# Altium footprint library Connectors.PcbLib: 101 footprints (part 2 of 7)
Each footprint in its own frame and in the unit in brackets; x right, y up, seen from the top. Pads: shape width x height; smd on the part's side, far side on the other; paste and mask are expansions set on the pad; w line width, h text height; cw(c..) or ccw(c..) is an arc to the next point about the centre after c.
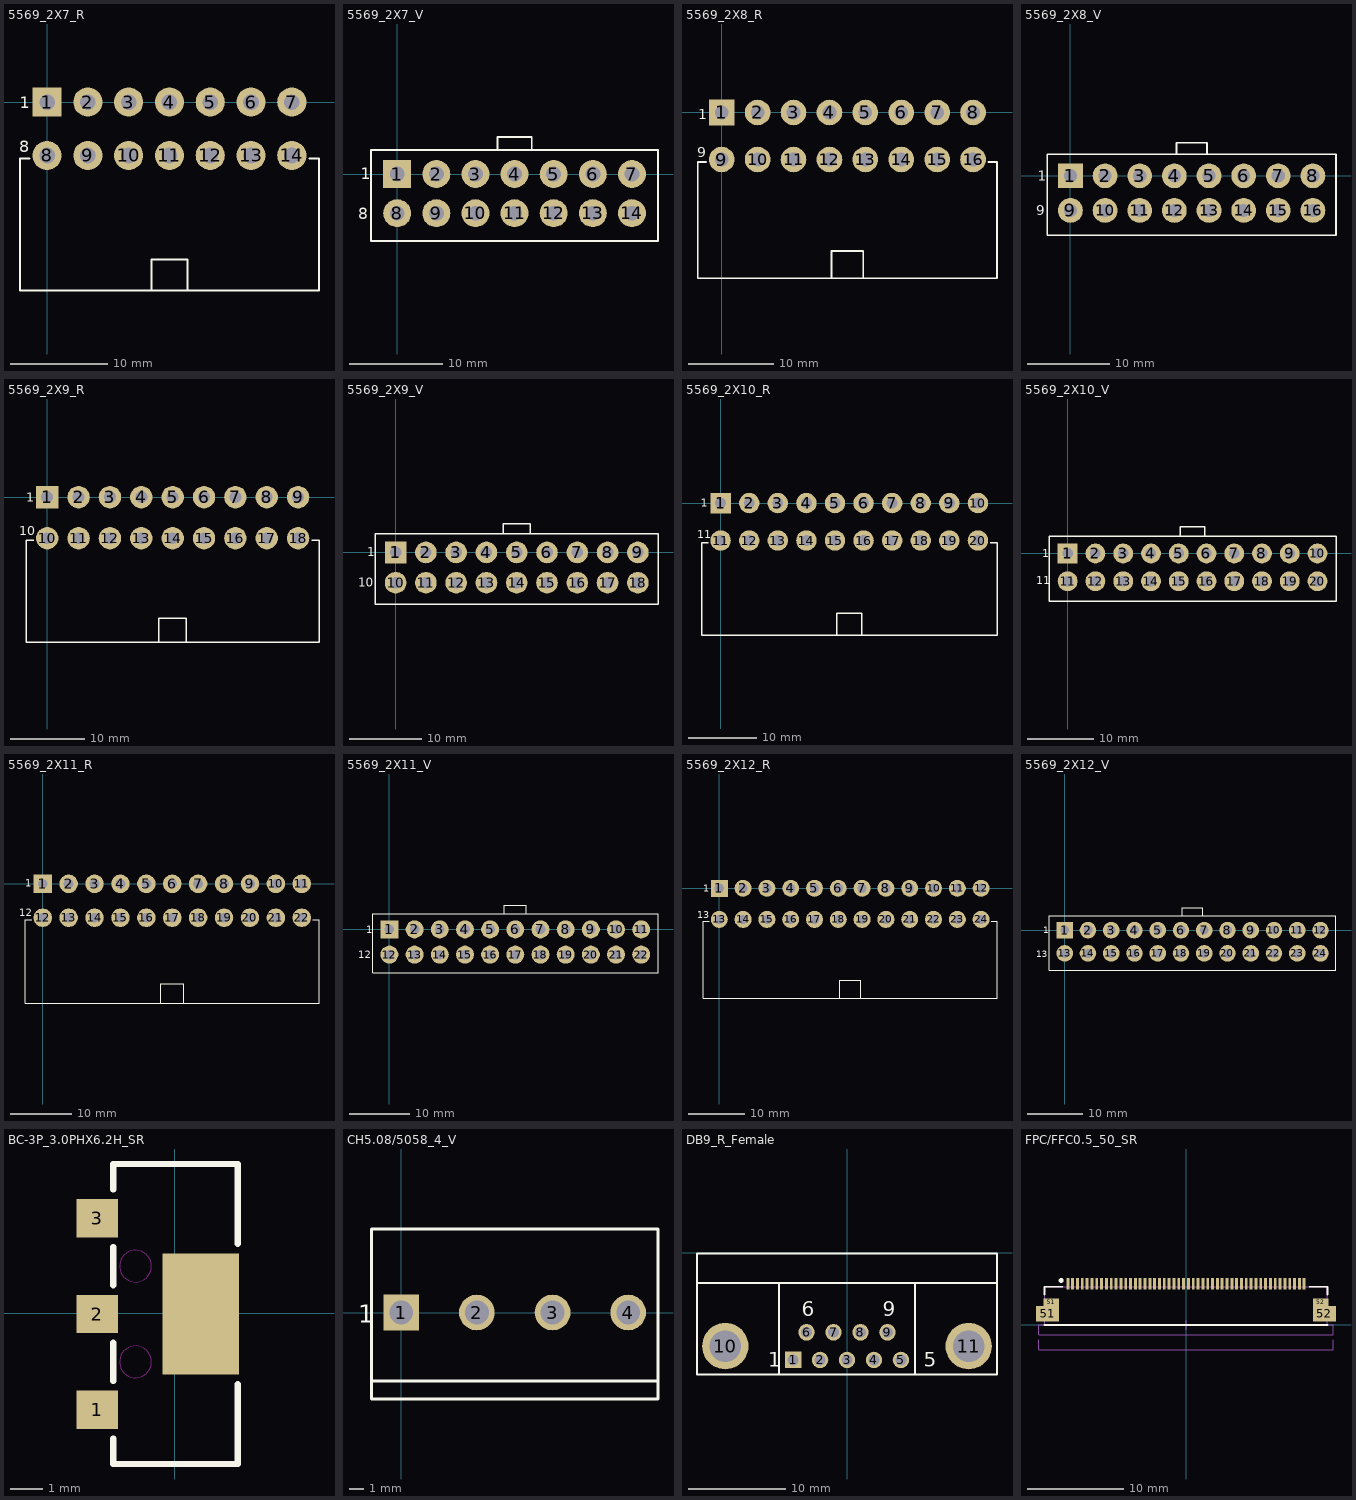
[diagram p1: the footprints below, top view; thin cyan lines are the x and y axes]

## 5569_2X7_R [mm] "5569 Connector, 7-Pin, Dual row, Right Angle"
pads (14):
  rect 3x3 hole 1.6 paste+0 mask+0.1: 1(0,0)
  round 3 hole 1.6 paste+0 mask+0.1: 2(4.2,0) 3(8.4,0) 4(12.6,0) 5(16.8,0) 6(21,0) 7(25.2,0) 8(0,-5.5) 9(4.2,-5.5) 10(8.4,-5.5) 11(12.6,-5.5) 12(16.8,-5.5) 13(21,-5.5) 14(25.2,-5.5)
Top Overlay:
  lines w0.2: -1.8,-5.8 -2.8,-5.8 -2.8,-19.4 28,-19.4 28,-5.8 27,-5.8 ; 10.75,-19.4 10.75,-16.2 14.45,-16.2 14.45,-19.385
  text "8" at -2.89,-5.17 h1.2
  text "1" at -2.8,-0.65 h1.2
3D body "874271402.stp": height 11.4, standoff -3.3, extent -3.3,-19.385 28.5,0.55

## 5569_2X7_V [mm] "5569 Connector, 7-Pin, Dual row, Vertical"
pads (14):
  rect 3x3 hole 1.6 paste+0 mask+0.1: 1(0,0)
  round 3 hole 1.6 paste+0 mask+0.1: 2(4.2,0) 3(8.4,0) 4(12.6,0) 5(16.8,0) 6(21,0) 7(25.2,0) 8(0,-4.2) 9(4.2,-4.2) 10(8.4,-4.2) 11(12.6,-4.2) 12(16.8,-4.2) 13(21,-4.2) 14(25.2,-4.2)
Top Overlay:
  lines w0.2: 10.75,2.6 10.75,4 14.45,4 14.45,2.6 ; -2.8,-7.2 28,-7.2 28,2.6 -2.8,2.6 -2.8,-7.2
  text "1" at -3.92,-0.57 h1.2
  text "8" at -4.21,-4.86 h1.2
3D body "874271442.stp": height 13.5, standoff -3.3, extent -3.3,-7.5 28.5,3.9

## 5569_2X8_R [mm] "5569 Connector, 8-Pin, Dual row, Right Angle"
pads (16):
  rect 3x3 hole 1.6 paste+0 mask+0.1: 1(0,0)
  round 3 hole 1.6 paste+0 mask+0.1: 2(4.2,0) 3(8.4,0) 4(12.6,0) 5(16.8,0) 6(21,0) 7(25.2,0) 8(29.4,0) 9(0,-5.5) 10(4.2,-5.5) 11(8.4,-5.5) 12(12.6,-5.5) 13(16.8,-5.5) 14(21,-5.5) 15(25.2,-5.5) 16(29.4,-5.5)
Top Overlay:
  lines w0.2: -1.8,-5.8 -2.8,-5.8 -2.8,-19.4 32.2,-19.4 32.2,-5.8 31.2,-5.8 ; 12.85,-19.4 12.85,-16.2 16.55,-16.2 16.55,-19.385
  text "9" at -2.89,-5.21 h1.2
  text "1" at -2.77,-0.8 h1.2
3D body "874271602.stp": height 11.4, standoff -3.3, extent -3.3,-19.385 32.7,0.55

## 5569_2X8_V [mm] "5569 Connector, 8-Pin, Dual row, Vertical"
pads (16):
  rect 3x3 hole 1.6 paste+0 mask+0.1: 1(0,0)
  round 3 hole 1.6 paste+0 mask+0.1: 2(4.2,0) 3(8.4,0) 4(12.6,0) 5(16.8,0) 6(21,0) 7(25.2,0) 8(29.4,0) 9(0,-4.2) 10(4.2,-4.2) 11(8.4,-4.2) 12(12.6,-4.2) 13(16.8,-4.2) 14(21,-4.2) 15(25.2,-4.2) 16(29.4,-4.2)
Top Overlay:
  lines w0.2: 12.85,2.6 12.85,4 16.55,4 16.55,2.6 ; -2.8,-7.2 32.2,-7.2 32.2,2.6 -2.8,2.6 -2.8,-7.2
  text "9" at -4.18,-4.79 h1.2
  text "1" at -3.94,-0.57 h1.2
3D body "874271642.stp": height 13.5, standoff -3.3, extent -3.3,-7.5 32.7,3.9

## 5569_2X9_R [mm] "5569 Connector, 9-Pin, Dual row, Right Angle"
pads (18):
  rect 3x3 hole 1.6 paste+0 mask+0.1: 1(0,0)
  round 3 hole 1.6 paste+0 mask+0.1: 2(4.2,0) 3(8.4,0) 4(12.6,0) 5(16.8,0) 6(21,0) 7(25.2,0) 8(29.4,0) 9(33.6,0) 10(0,-5.5) 11(4.2,-5.5) 12(8.4,-5.5) 13(12.6,-5.5) 14(16.8,-5.5) 15(21,-5.5) 16(25.2,-5.5) 17(29.4,-5.5) 18(33.6,-5.5)
Top Overlay:
  lines w0.2: -1.8,-5.8 -2.8,-5.8 -2.8,-19.4 36.4,-19.4 36.4,-5.8 35.4,-5.8 ; 14.95,-19.4 14.95,-16.2 18.65,-16.2 18.65,-19.385
  text "10" at -3.78,-5.09 h1.2
  text "1" at -2.78,-0.59 h1.2
3D body "874271802.stp": height 11.4, standoff -3.3, extent -3.3,-19.385 36.9,0.55

## 5569_2X9_V [mm] "5569 Connector, 9-Pin, Dual row, Vertical"
pads (18):
  rect 3x3 hole 1.6 paste+0 mask+0.1: 1(0,0)
  round 3 hole 1.6 paste+0 mask+0.1: 2(4.2,0) 3(8.4,0) 4(12.6,0) 5(16.8,0) 6(21,0) 7(25.2,0) 8(29.4,0) 9(33.6,0) 10(0,-4.2) 11(4.2,-4.2) 12(8.4,-4.2) 13(12.6,-4.2) 14(16.8,-4.2) 15(21,-4.2) 16(25.2,-4.2) 17(29.4,-4.2) 18(33.6,-4.2)
Top Overlay:
  lines w0.2: 14.95,2.6 14.95,4 18.65,4 18.65,2.6 ; -2.8,-7.2 -2.8,2.6 36.4,2.6 36.4,-7.2 -2.8,-7.2
  text "10" at -5.22,-4.74 h1.2
  text "1" at -3.91,-0.55 h1.2
3D body "874271842.stp": height 13.5, standoff -3.3, extent -3.3,-7.5 36.9,3.9

## 5569_2X10_R [mm] "5569 Connector, 10-Pin, Dual row, Right Angle"
pads (20):
  rect 3x3 hole 1.6 paste+0 mask+0.1: 1(0,0)
  round 3 hole 1.6 paste+0 mask+0.1: 2(4.2,0) 3(8.4,0) 4(12.6,0) 5(16.8,0) 6(21,0) 7(25.2,0) 8(29.4,0) 9(33.6,0) 10(37.8,0) 11(0,-5.5) 12(4.2,-5.5) 13(8.4,-5.5) 14(12.6,-5.5) 15(16.8,-5.5) 16(21,-5.5) 17(25.2,-5.5) 18(29.4,-5.5) 19(33.6,-5.5) 20(37.8,-5.5)
Top Overlay:
  lines w0.2: -1.8,-5.8 -2.8,-5.8 -2.8,-19.4 40.6,-19.4 40.6,-5.8 39.6,-5.8 ; 17.05,-19.4 17.05,-16.2 20.75,-16.2 20.75,-19.385
  text "11" at -3.47,-5.18 h1.2
  text "1" at -2.93,-0.51 h1.2
3D body "874272002.stp": height 11.4, standoff -3.3, extent -3.3,-19.385 41.1,0.55

## 5569_2X10_V [mm] "5569 Connector, 10-Pin, Dual row, Vertical"
pads (20):
  rect 3x3 hole 1.6 paste+0 mask+0.1: 1(0,0)
  round 3 hole 1.6 paste+0 mask+0.1: 2(4.2,0) 3(8.4,0) 4(12.6,0) 5(16.8,0) 6(21,0) 7(25.2,0) 8(29.4,0) 9(33.6,0) 10(37.8,0) 11(0,-4.2) 12(4.2,-4.2) 13(8.4,-4.2) 14(12.6,-4.2) 15(16.8,-4.2) 16(21,-4.2) 17(25.2,-4.2) 18(29.4,-4.2) 19(33.6,-4.2) 20(37.8,-4.2)
Top Overlay:
  lines w0.2: 17.05,2.6 17.05,4 20.75,4 20.75,2.6 ; -2.8,-7.2 -2.8,2.6 40.6,2.6 40.6,-7.2 -2.8,-7.2
  text "11" at -4.79,-4.69 h1.2
  text "1" at -3.87,-0.55 h1.2
3D body "874272042.stp": height 13.5, standoff -3.3, extent -3.3,-7.5 41.1,3.9

## 5569_2X11_R [mm] "5569 Connector, 11-Pin, Dual row, Right Angle"
pads (22):
  rect 3x3 hole 1.6 paste+0 mask+0.1: 1(0,0)
  round 3 hole 1.6 paste+0 mask+0.1: 2(4.2,0) 3(8.4,0) 4(12.6,0) 5(16.8,0) 6(21,0) 7(25.2,0) 8(29.4,0) 9(33.6,0) 10(37.8,0) 11(42,0) 12(0,-5.5) 13(4.2,-5.5) 14(8.4,-5.5) 15(12.6,-5.5) 16(16.8,-5.5) 17(21,-5.5) 18(25.2,-5.5) 19(29.4,-5.5) 20(33.6,-5.5) 21(37.8,-5.5) 22(42,-5.5)
Top Overlay:
  lines w0.2: -1.8,-5.8 -2.8,-5.8 -2.8,-19.4 44.8,-19.4 44.8,-5.8 43.8,-5.8 ; 19.15,-19.4 19.15,-16.2 22.85,-16.2 22.85,-19.385
  text "12" at -3.85,-5.23 h1.2
  text "1" at -2.81,-0.51 h1.2
3D body "874272202.stp": height 11.4, standoff -3.3, extent -3.3,-19.385 45.3,0.55

## 5569_2X11_V [mm] "5569 Connector, 11-Pin, Dual row, Vertical"
pads (22):
  rect 3x3 hole 1.6 paste+0 mask+0.1: 1(0,0)
  round 3 hole 1.6 paste+0 mask+0.1: 2(4.2,0) 3(8.4,0) 4(12.6,0) 5(16.8,0) 6(21,0) 7(25.2,0) 8(29.4,0) 9(33.6,0) 10(37.8,0) 11(42,0) 12(0,-4.2) 13(4.2,-4.2) 14(8.4,-4.2) 15(12.6,-4.2) 16(16.8,-4.2) 17(21,-4.2) 18(25.2,-4.2) 19(29.4,-4.2) 20(33.6,-4.2) 21(37.8,-4.2) 22(42,-4.2)
Top Overlay:
  lines w0.2: 19.15,2.6 19.15,4 22.85,4 22.85,2.6 ; -2.8,-7.2 -2.8,2.6 44.8,2.6 44.8,-7.2 -2.8,-7.2
  text "1" at -3.88,-0.61 h1.2
  text "12" at -5.24,-4.84 h1.2
3D body "874272242.stp": height 13.5, standoff -3.3, extent -3.3,-7.5 45.3,3.9

## 5569_2X12_R [mm] "5569 Connector, 12-Pin, Dual row, Right Angle"
pads (24):
  rect 3x3 hole 1.6 paste+0 mask+0.1: 1(0,0)
  round 3 hole 1.6 paste+0 mask+0.1: 2(4.2,0) 3(8.4,0) 4(12.6,0) 5(16.8,0) 6(21,0) 7(25.2,0) 8(29.4,0) 9(33.6,0) 10(37.8,0) 11(42,0) 12(46.2,0) 13(0,-5.5) 14(4.2,-5.5) 15(8.4,-5.5) 16(12.6,-5.5) 17(16.8,-5.5) 18(21,-5.5) 19(25.2,-5.5) 20(29.4,-5.5) 21(33.6,-5.5) 22(37.8,-5.5) 23(42,-5.5) 24(46.2,-5.5)
Top Overlay:
  lines w0.2: -1.8,-5.8 -2.8,-5.8 -2.8,-19.4 49,-19.4 49,-5.8 48,-5.8 ; 21.25,-19.4 21.25,-16.2 24.95,-16.2 24.95,-19.385
  text "1" at -2.82,-0.6 h1.2
  text "13" at -3.93,-5.28 h1.2
3D body "874272402.stp": height 11.4, standoff -3.3, extent -3.3,-19.385 49.5,0.55

## 5569_2X12_V [mm] "5569 Connector, 12-Pin, Dual row, Vertical"
pads (24):
  rect 3x3 hole 1.6 paste+0 mask+0.1: 1(0,0)
  round 3 hole 1.6 paste+0 mask+0.1: 2(4.2,0) 3(8.4,0) 4(12.6,0) 5(16.8,0) 6(21,0) 7(25.2,0) 8(29.4,0) 9(33.6,0) 10(37.8,0) 11(42,0) 12(46.2,0) 13(0,-4.2) 14(4.2,-4.2) 15(8.4,-4.2) 16(12.6,-4.2) 17(16.8,-4.2) 18(21,-4.2) 19(25.2,-4.2) 20(29.4,-4.2) 21(33.6,-4.2) 22(37.8,-4.2) 23(42,-4.2) 24(46.2,-4.2)
Top Overlay:
  lines w0.2: 21.25,2.6 21.25,4 24.95,4 24.95,2.6 ; -2.8,-7.2 49,-7.2 49,2.6 -2.8,2.6 -2.8,-7.2
  text "13" at -5.19,-4.88 h1.2
  text "1" at -3.9,-0.52 h1.2
3D body "874272442.stp": height 13.5, standoff -3.3, extent -3.3,-7.5 49.5,3.9

## BC-3P_3.0PHX6.2H_SR [mm] "Battery connector, 3 Pin, 3.0mm Pitch, 5.4mm Hight, Surface mount, Right angle"
pads (4):
  rect 1.3x1.2 smd paste+0 mask+0.1: 1(-2.43,-3.02) 2(-2.43,-0.02) 3(-2.43,2.98)
  rect 2.4x3.8 smd paste+0 mask+0.1: ""(0.82,-0.02)
Top Overlay:
  lines w0.2: -1.93,-3.92 -1.93,-4.72 1.97,-4.72 1.97,-2.22 ; -1.93,-2.12 -1.93,-0.92 ; -1.93,0.88 -1.93,2.08 ; -1.93,3.88 -1.93,4.68 1.97,4.68 1.97,2.18
Keep-Out Layer:
  circle w0.01: c-1.23,-1.52 r0.5
  circle w0.01: c-1.23,1.48 r0.5
3D body "AVX Interconnect-00-9155-003-301-006.STEP": height 6, standoff -0.1, extent -2.59,-4.45 2.99,4.45

## CH5.08/5058_4_V [mm] "CH5.08/5058 Connector, 4-Pin, Vertical"
pads (4):
  rect 2.4x2.4 hole 1.6 paste+0 mask+0.1: 1(0,0)
  round 2.4 hole 1.6 paste+0 mask+0.1: 2(5.08,0) 3(10.16,0) 4(15.24,0)
Top Overlay:
  lines w0.2: -2,-4.6 -2,5.6 17.24,5.6 17.24,-4.6 ; -2,-4.6 17.24,-4.6 ; -2,-4.6 -2,-5.8 17.24,-5.8 17.24,-4.6
  text "1" at -2.9,-0.69 h1.2
3D body "010321041.stp": height 13.85, standoff -3.6, extent -2,-5.8 17.24,5.6

## DB9_R_Female [mm]
pads (11):
  rect 1.69x1.69 hole 1.09: 1(-5.54,-11.02)
  round 1.69 hole 1.09: 2(-2.77,-11.02) 3(0,-11.02) 4(2.77,-11.02) 5(5.54,-11.02) 6(-4.155,-8.18) 7(-1.385,-8.18) 8(1.385,-8.18) 9(4.155,-8.18)
  round 4.76 hole 3.26: 10(-12.495,-9.6) 11(12.495,-9.6)
Top Overlay:
  lines w0.2: -15.4,-3.1 15.4,-3.1 ; -7,-12.5 -7,-3.1 ; 7,-12.5 7,-3.1 ; -15.4,-12.5 -15.4,-0.1 15.4,-0.1 15.4,-12.5 -15.4,-12.5
  text "1" at -8.064,-11.72 h1.5
  text "5" at 7.874,-11.72 h1.5
  text "9" at 3.683,-6.513 h1.5
  text "6" at -4.635,-6.513 h1.5
3D body "DB9 - 203-09SCKKBE.STEP": height 12.75, standoff -4.25, extent -15.405,-12.481 15.405,6.069

## FPC/FFC0.5_50_SR [mm] "FPC/FFC Connector，0.5mm Pitch，50 Pin，Surface mount, Right Angle"
pads (54):
  rect 0.3x1.2 smd: 1(-12.25,4.25) 2(-11.75,4.25) 3(-11.25,4.25) 4(-10.75,4.25) 5(-10.25,4.25) 6(-9.75,4.25) 7(-9.25,4.25) 8(-8.75,4.25) 9(-8.25,4.25) 10(-7.75,4.25) 11(-7.25,4.25) 12(-6.75,4.25) 13(-6.25,4.25) 14(-5.75,4.25) 15(-5.25,4.25) 16(-4.75,4.25) 17(-4.25,4.25) 18(-3.75,4.25) 19(-3.25,4.25) 20(-2.75,4.25) 21(-2.25,4.25) 22(-1.75,4.25) 23(-1.25,4.25) 24(-0.75,4.25) 25(-0.25,4.25) 26(0.25,4.25) 27(0.75,4.25) 28(1.25,4.25) 29(1.75,4.25) 30(2.25,4.25) 31(2.75,4.25) 32(3.25,4.25) 33(3.75,4.25) 34(4.25,4.25) 35(4.75,4.25) 36(5.25,4.25) 37(5.75,4.25) 38(6.25,4.25) 39(6.75,4.25) 40(7.25,4.25) 41(7.75,4.25) 42(8.25,4.25) 43(8.75,4.25) 44(9.25,4.25) 45(9.75,4.25) 46(10.25,4.25) 47(10.75,4.25) 48(11.25,4.25) 49(11.75,4.25) 50(12.25,4.25)
  rect 2.4x1.6 smd: 51(-14.35,1.15) 52(14.35,1.15)
  rect 1.6x0.8 smd: 51(-13.95,2.35) 52(13.95,2.35)
Top Overlay:
  circle w0.25: c-12.95,4.6 r0.125
  lines w0.2: -14.65,0 14.65,0 ; -14.65,3.15 -14.65,3.95 -12.8,3.95 ; 12.8,3.95 14.65,3.95 14.65,3.15
Mechanical 13:
  lines w0.1: -15.25,-1.55 -15.25,-2.6 15.25,-2.6 15.25,-1.55 ; -15.25,-1.05 -15.25,0 15.25,0 15.25,-1.05 -15.25,-1.05 ; -14.65,0 14.65,0 14.65,3.95 -14.65,3.95 -14.65,0
Mechanical 15:
  lines w0.1: -0.5,0 0.5,0 ; 0,-0.5 0,0.5
3D body "541045033.stp": height 2, standoff -0.05, extent -15.25,-2.359 15.25,4.791